# Altium footprint library First Board IMX6.PcbLib: 204 footprints (part 12 of 13)
Each footprint in its own frame and in the unit in brackets; x right, y up, seen from the top. Pads: shape width x height; smd on the part's side, far side on the other; paste and mask are expansions set on the pad; w line width, h text height; cw(c..) or ccw(c..) is an arc to the next point about the centre after c.
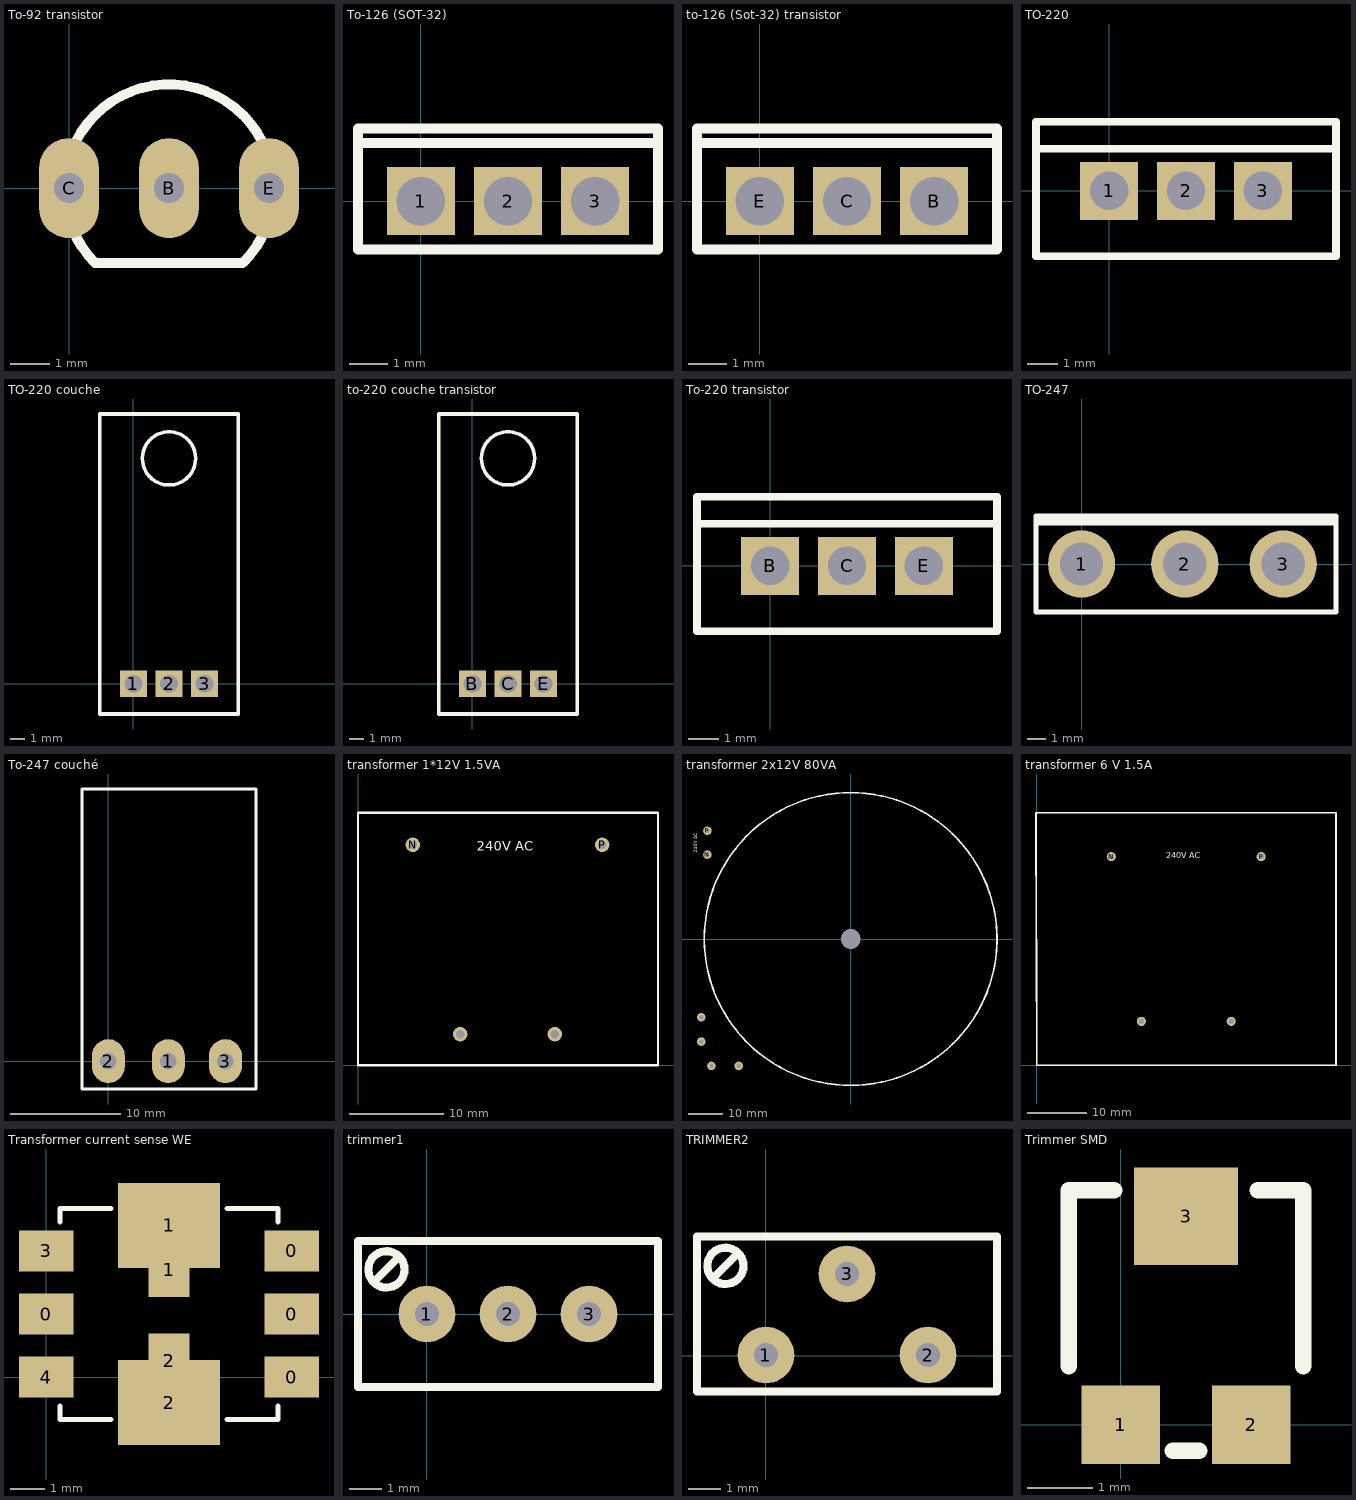
[diagram p11: the footprints below, top view; thin cyan lines are the x and y axes]

## To-92 transistor [mil]
pads (3):
  oval 60x100 hole 30: B(100,0) C(0,0) E(200,0)
Top Overlay:
  lines w10: 173.72,-75.04 ccw(c100,-0.85) 26.24,-75 173.72,-75
3D body "TO92.step": height 285.04, standoff -159.79, extent -8.87,-60 208.87,101.42

## To-126 (SOT-32) [mil]
pads (3):
  rect 70x70 hole 50: 1(0,0) 2(90,0) 3(180,0)
Top Overlay:
  lines w10: -65,50 -65,-50 ; -65,60 245,60 ; -65,-50 245,-50 245,75 -65,75 -65,-50
3D body "TO-126.STEP": height 780.6, standoff -313.89, extent -67.48,-50 247.48,77.96

## to-126 (Sot-32) transistor [mil]
pads (3):
  rect 70x70 hole 50: B(180,0) C(90,0) E(0,0)
Top Overlay:
  lines w10: -65,50 -65,-50 ; -65,60 245,60 ; -65,-50 -65,75 245,75 245,-50 -65,-50
3D body "TO-126.STEP": height 780.6, standoff -313.89, extent -67.48,-50 247.48,77.96

## TO-220 [mm]
pads (3):
  rect 1.905x1.905 hole 1.27: 1(0,0) 2(2.54,0) 3(5.08,0)
Top Overlay:
  lines w0.254: -2.413,1.397 7.493,1.397 ; -2.413,-2.159 7.493,-2.159 7.493,2.286 -2.413,2.286 -2.413,-2.159
3D body "TO-220-3.step": height 20.58, standoff -8.2, extent -2.41,-2.159 7.49,2.341

## TO-220 couche [mm]
pads (3):
  rect 1.905x1.905 hole 1.27: 1(0,0) 2(2.54,0) 3(5.08,0)
Top Overlay:
  circle w0.254: c2.54,16.129 r1.905
  lines w0.254: -2.413,-2.159 7.493,-2.159 7.493,19.304 -2.413,19.304 -2.413,-2.159
3D body "To220 couché.step": height 4.2, standoff -3, extent -2.54,-0.254 7.62,19.236

## to-220 couche transistor [mm]
pads (3):
  rect 1.905x1.905 hole 1.27: B(0,0) C(2.54,0) E(5.08,0)
Top Overlay:
  circle w0.254: c2.54,16.129 r1.905
  lines w0.254: -2.413,-2.159 7.493,-2.159 7.493,19.304 -2.413,19.304 -2.413,-2.159
3D body "To220 couché.step": height 4.2, standoff -3, extent -2.54,-0.254 7.62,19.236

## To-220 transistor [mm]
pads (3):
  rect 1.905x1.905 hole 1.27: B(0,0) C(2.54,0) E(5.08,0)
Top Overlay:
  lines w0.254: -2.413,1.397 7.493,1.397 ; -2.413,-2.159 7.493,-2.159 7.493,2.286 -2.413,2.286 -2.413,-2.159
3D body "TO-220-3.step": height 20.58, standoff -8.2, extent -2.41,-2.159 7.49,2.341

## TO-247 [mil]
pads (3):
  round 140 hole 90: 1(0,0) 2(215,0) 3(420,0)
Top Overlay:
  rectangle: -95,80 530,100
  lines w10: -95,-100 -95,100 530,100 530,-100 -95,-100
3D body "TO247.step": height 1324.8, standoff -294.49, extent -95.98,-100.39 530,100.39

## To-247 couché [mm]
pads (3):
  oval 3x4 hole 1.5: 1(5.461,0) 2(0,0) 3(10.668,0)
Top Overlay:
  lines w0.254: 13.462,21.8 13.462,24.8 5.362,24.8 -2.413,24.8 -2.413,2.54 -2.413,-2.54 13.462,-2.54 13.462,2.54 13.462,22.7

## transformer 1*12V 1.5VA [mm]
pads (4):
  round 1.524 hole 0.9: +0VAC(20.8,3.3) +12VAC(10.8,3.3) N(5.8,23.3) P(25.8,23.3)
Top Overlay:
  lines w0.254: 0,0 31.7,0 31.7,26.7 1.8,26.7 0,26.7 0,0
  text "240V AC" at 12.554,22.654 h1

## transformer 2x12V 80VA [mm]
pads (7):
  round 1.524 hole 5.8: 8(0,0)
  round 2.5 hole 1.3: "+0AC A"(-43.9,-23) "+0AC B"(-32.9,-37.3) "+12AC A"(-40.9,-37.3) "+12AC B"(-43.9,-30.15) N(-42.1,24.8) P(-42.1,31.8)
Top Overlay:
  circle w0.5: c0,0 r43
  text "240V AC" at -45.054,25.354 h1

## transformer 6 V 1.5A [mm]
pads (4):
  round 1.524 hole 0.9: +0VAC(17.5,7.3) +6VAC(32.5,7.3) N(12.472,34.812) P(37.5,34.8)
Top Overlay:
  lines w0.254: -0.1,42.1 50,42.1 50,0 0,0 -0.1,42.1
  text "240V AC" at 21.654,34.554 h1

## Transformer current sense WE [mm]
pads (10):
  rect 1.6x1.2 smd: 0(0,1.85) 0(7.2,0) 0(7.2,1.85) 0(7.2,3.7) 3(0,3.7) 4(0,0)
  rect 1.2x1.6 smd: 1(3.6,3.15) 2(3.6,0.475)
  rect 3x2.5 smd: 1(3.6,4.45) 2(3.6,-0.75)
Top Overlay:
  lines w0.15: 0.4,-0.85 0.4,-1.25 1.9,-1.25 ; 0.4,4.55 0.4,4.95 1.9,4.95 ; 5.3,-1.25 6.8,-1.25 6.8,-0.85 ; 5.3,4.95 6.8,4.95 6.8,4.55
3D body "UtCST_749251125.stp": height 5.44, standoff 0.01, extent -0.25,-1.6 7.45,5.3

## trimmer1 [mil]
pads (3):
  round 70 hole 30: 1(0,0) 2(100,0) 3(200,0)
Top Overlay:
  circle w10: c-50,55 r22.36
  lines w10: -65,40 -35,70 ; -85,-90 -85,90 285,90 285,-90 -85,-90
3D body "pot 25 tours.step": height 459.72, standoff -57.99, extent -87.59,-94.49 287.6,94.49

## TRIMMER2 [mil]
pads (3):
  round 70 hole 30: 1(0,1.06) 2(200,1.06) 3(100,101.06)
Top Overlay:
  circle w10: c-50,111.06 r22.36
  lines w10: -65,96.06 -35,126.06 ; -85,-43.94 285,-43.94 285,147.37 -85,147.37 -85,-43.94
3D body "Trimmer vertical decale.step": height 454.72, standoff -82.68, extent -87.59,-41.61 287.6,147.37

## Trimmer SMD [mm]
pads (3):
  rect 1.2x1.2 smd: 1(0,0) 2(2,0)
  rect 1.6x1.5 smd: 3(1,3.2)
Top Overlay:
  lines w0.254: -0.8,0.9 -0.8,3.6 -0.1,3.6 ; 0.8,-0.4 1.2,-0.4 ; 2.1,3.6 2.8,3.6 2.8,0.9
3D body "trimmer TC33.step": height 1.23, standoff 0.08, extent -0.8,-0.313 2.8,3.65